# Altium footprint library 15.Switches&Relay.PcbLib: 33 footprints (part 2 of 3)
Each footprint in its own frame and in the unit in brackets; x right, y up, seen from the top. Pads: shape width x height; smd on the part's side, far side on the other; paste and mask are expansions set on the pad; w line width, h text height; cw(c..) or ccw(c..) is an arc to the next point about the centre after c.
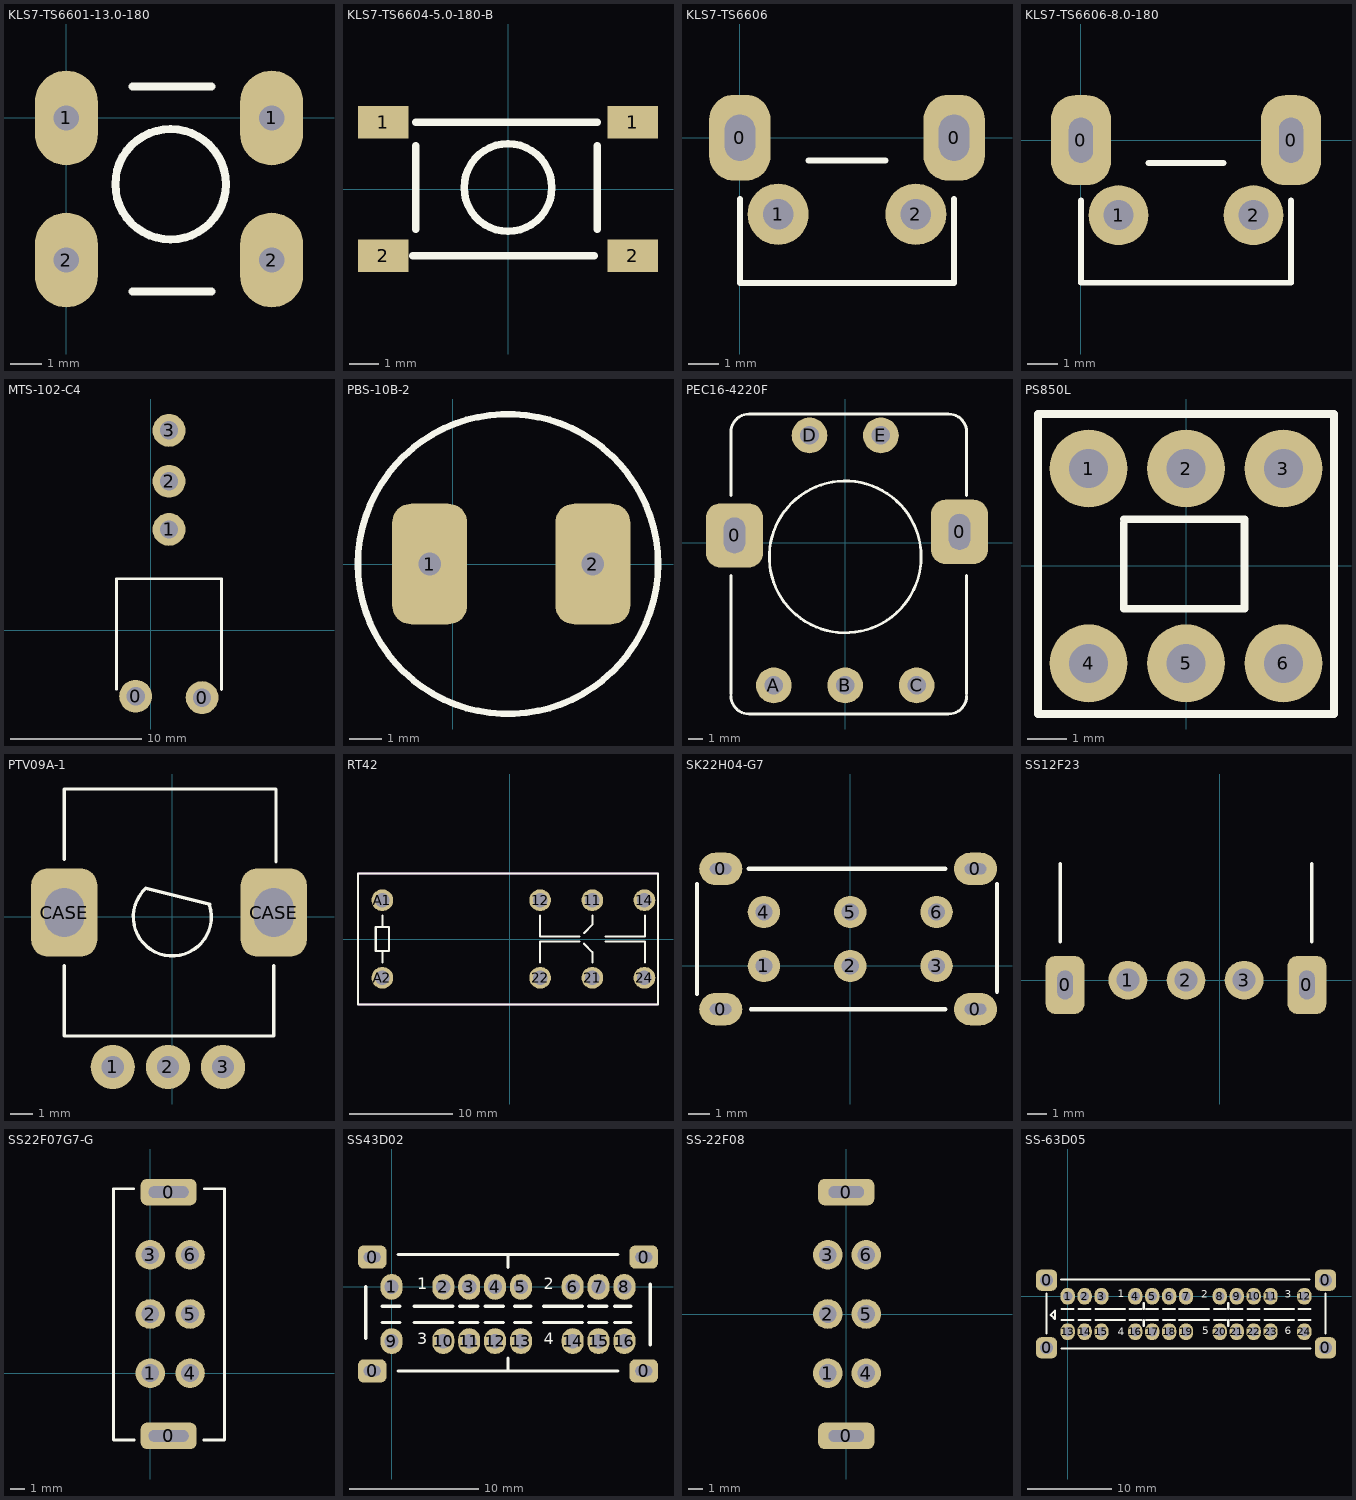
[diagram p1: the footprints below, top view; thin cyan lines are the x and y axes]

## KLS7-TS6601-13.0-180 [mm]
pads (4):
  oval 2x3 hole 0.8 square: 1(0,0) 1(6.5,0) 2(0,-4.5) 2(6.5,-4.5)
Top Overlay:
  circle w0.254: c3.3,-2.1 r1.75
  lines w0.254: 2.1,-5.5 4.6,-5.5 ; 2.1,1 4.6,1
3D body "button_hole_6x6x13.0.STEP": height 13, standoff -3.5, extent -0.763,-5.2 6.963,0.8

## KLS7-TS6604-5.0-180-B [mm]
pads (4):
  rect 1.7x1.1 smd: 1(-4.2,2.25) 1(4.2,2.25) 2(-4.2,-2.25) 2(4.2,-2.25)
Top Overlay:
  circle w0.254: c0,0.05 r1.476
  lines w0.254: -3.2,-2.25 2.9,-2.25 ; -3.1,-1.35 -3.1,1.45 ; -3.1,2.25 3,2.25 ; 3,-1.35 3,1.45
3D body "User Library-PTS645SL43SMTR92-LFS.STEP": height 4.5, standoff 0.2, extent -4.5,-3.05 4.5,2.95

## KLS7-TS6606 [mm]
pads (4):
  rrect80% 2x2.8 hole 1 slot 1.5 at 90 deg: 0(0,0) 0(7,0)
  round 2 hole 1: 1(1.25,-2.5) 2(5.75,-2.5)
Top Overlay:
  lines w0.2: 0,-2 0,-4.75 7,-4.75 7,-2 ; 2.25,-0.75 4.75,-0.75
3D body "User Library-Alps TACT SKHH Horizontal Switch.step": height 7.37, standoff -3.5, extent -0.679,-6.47 7.684,1.5

## KLS7-TS6606-8.0-180 [mm]
pads (4):
  rrect80% 2x3 hole 0.8 slot 1.5 at 90 deg: 0(0,0) 0(7,0)
  round 2 hole 1: 1(1.25,-2.5) 2(5.75,-2.5)
Top Overlay:
  lines w0.2: 0,-2 0,-4.75 7,-4.75 7,-2 ; 2.25,-0.75 4.75,-0.75
3D body "User Library-TS-A6PV-130.STEP": height 7.45, standoff -3.45, extent -0.25,-14.025 7.15,1.525

## MTS-102-C4 [mm]
pads (5):
  round 2.5 hole 1.4: 0(-1.142,-5.033) 0(3.915,-5.139) 1(1.4,7.661) 2(1.4,11.332) 3(1.4,15.2)
Top Overlay:
  lines w0.2: -2.6,-4.5 -2.6,3.9 5.4,3.9 5.4,-4.525
3D body "User Library-MTS.step": height 13.6, standoff -2.8, extent -2.55,-19.495 5.35,15.65

## PBS-10B-2 [mm]
pads (2):
  rrect50% 2.3x3.7 hole 0.7 square: 1(-0.7,0) 2(4.3,0)
Top Overlay:
  circle w0.2: c1.7,0 r4.6
3D body "User Library-PBS-10B.STEP": height 24.5, standoff -3.25, extent -2.95,-4.75 6.55,4.75

## PEC16-4220F [mm]
pads (7):
  rrect50% 4x4.5 hole 2.5 slot 1.5 at 0 deg: 0(-7.75,0.5) 0(8,0.75)
  round 2.5 hole 1.3: A(-5,-10) B(0,-10) C(5,-10) D(-2.5,7.5) E(2.5,7.5)
Top Overlay:
  circle w0.2: c0,-1 r5.315
  lines w0.2: -8,-10.73 ccw(c-6.73,-10.73) -6.73,-12 7.23,-12 ccw(c7.23,-10.73) 8.5,-10.73 ; -8,-10.6 -8,-2.3 ; -8,3.3 -8,7.73 cw(c-6.73,7.73) -6.73,9 0,9 7.23,9 cw(c7.23,7.73) 8.5,7.73 8.5,3.3 ; 8.5,-10.6 8.5,-2.3
3D body "User Library-Encoder PEC16-4220F-S0024 BOURNS.step": height 28, standoff -3.5, extent -8.175,-11.95 8.325,8.85

## PS850L [mm]
pads (6):
  round 2 hole 1: 1(-2.5,2.5) 2(0,2.5) 3(2.5,2.5) 4(-2.5,-2.5) 5(0,-2.5) 6(2.5,-2.5)
Top Overlay:
  lines w0.2: -3.8,3.6 -3.8,3.8 -3.8,3.9 3.8,3.9 3.8,-3.8 -3.8,-3.8 -3.8,3.7 ; -1.6,1.1 -1.6,-1.1 1.5,-1.1 1.5,1.2 -1.6,1.2
3D body "User Library-button with fixation.step": height 13.3, standoff -3.7, extent -3.5,-3.5 3.5,3.5

## PTV09A-1 [mm]
pads (5):
  round 2 hole 1: 1(-2.7,-6.8) 2(-0.2,-6.8) 3(2.3,-6.8)
  rrect50% 3x4 hole 2.2 slot 1.8 at 0 deg: CASE(-4.9,0.2) CASE(4.6,0.2)
Top Overlay:
  lines w0.15: -4.9,-2.2 -4.9,-5.4 4.6,-5.4 4.6,-2.2 ; -4.9,2.6 -4.9,5.8 4.7,5.8 4.7,2.5 ; 1.689,0.528 cw(c0,0) -1.2,1.3 1.694,0.576
3D body "User Library-Knob-4.step": height 27.21, standoff 11.96, extent -7.628,-7.514 7.3,7.414
3D body "R-0904N-L-25F-black.step": height 25, standoff -3.8, extent -5.861,-6.8 5.461,5.8

## RT42 [mm]
pads (8):
  round 2.1 hole 1.4: 11(7.981,3.75) 12(2.941,3.75) 14(13.021,3.75) 21(7.981,-3.75) 22(2.941,-3.75) 24(13.021,-3.75) A1(-12.319,3.75) A2(-12.319,-3.75)
Top Overlay:
  lines w0.2: -12.319,-2.286 -12.319,-1.143 ; -12.319,1.143 -12.319,2.274 ; 2.921,-2.286 2.941,-0.254 6.731,-0.254 ; 2.921,2.274 2.921,0.254 6.731,0.254 ; 7.181,0.565 7.981,1.396 7.981,2.274 ; 7.182,-0.447 7.981,-1.27 7.981,-2.286 ; 9.271,-0.254 13.081,-0.254 13.081,-2.286 ; 9.271,0.254 13.081,0.254 13.081,2.274 ; -12.319,-1.143 -11.684,-1.143 -11.684,1.143 -12.954,1.143 -12.954,-1.143 -12.319,-1.143 ; -14.669,-6.35 -14.669,6.35 14.331,6.35 14.331,-6.35 -14.669,-6.35
Mechanical 13:
  lines w0.2: -14.669,-6.35 -14.669,6.35 14.331,6.35 14.331,-6.35 -14.669,-6.35
3D body "RT424005.stp": height 15.86, standoff -2.94, extent -14.529,-6.35 14.471,6.35

## SK22H04-G7 [mm]
pads (10):
  rrect100% 2x1.5 hole 1 slot 0.5 at 90 deg: 0(-6,-2) 0(-6,4.5) 0(5.8,-2) 0(5.8,4.5)
  round 1.5 hole 0.8: 1(-4,0) 2(0,0) 3(4,0) 4(-4,2.5) 5(0,2.5) 6(4,2.5)
Top Overlay:
  lines w0.2: -7.1,-1.3 -7.1,3.8 ; -4.7,4.5 4.4,4.5 ; -4.6,-2 4.4,-2 ; 6.8,-1.2 6.8,3.8
3D body: height 3, standoff -1, extent -6.2,-2.2 -5.8,-1.8
3D body: height 3, standoff -1, extent 5.6,-2.3 6,-1.9
3D body: height 3, standoff -1, extent 0,2.2 0.4,2.6
3D body: height 3, standoff -1, extent 3.8,2.2 4.2,2.6
3D body: height 3, standoff -1, extent -4.1,2.3 -3.7,2.7
3D body: height 3, standoff -1, extent 3.8,-0.2 4.2,0.2
3D body: height 3, standoff -1, extent 0,-0.3 0.4,0.1
3D body: height 3, standoff -1, extent -4.1,-0.2 -3.7,0.2
3D body: height 6.5, standoff 4, extent -2.4,-9 0.1,-2
3D body: height 8.5, standoff 3, extent -7.1,-2 6.8,4.5
3D body: height 3, standoff -1, extent 5.9,4.2 6.3,4.6
3D body: height 3, standoff -1, extent -6.1,4.3 -5.7,4.7

## SS12F23 [mm]
pads (5):
  rrect50% 2x3 hole 1.5 slot 0.8 at 0 deg: 0(-8,-0.25) 0(4.5,-0.25)
  round 2 hole 1.2: 1(-4.75,0) 2(-1.75,0) 3(1.25,0)
Top Overlay:
  lines w0.2: -8.25,2 -8.25,6 ; 4.75,2 4.75,6
3D body "User Library-SLIDE SWITCH SS12F23.STEP": height 5.95, standoff -3.15, extent -8.25,-0.75 4.75,12.15

## SS22F07G7-G [mm]
pads (8):
  rrect50% 3.8x1.8 hole 2.7 slot 0.8 at 90 deg: 0(1.25,-4.25) 0(1.25,12.25)
  round 2 hole 1.2: 1(0,0) 2(0,4) 3(0,8) 4(2.7,0) 5(2.7,4) 6(2.7,8)
Top Overlay:
  lines w0.2: -1.125,12.475 -2.475,12.475 -2.475,-4.525 -1.075,-4.525 ; 3.625,-4.525 5.025,-4.525 5.025,12.475 3.675,12.475
3D body "User Library-SS22F07G7-G.STEP": height 16.08, standoff -2.4, extent -2.475,-4.525 5.025,12.475

## SS43D02 [mm]
pads (20):
  rrect50% 2.2x1.8 hole 1.3 slot 0.8 at 90 deg: 0(-1.5,-6.5) 0(-1.5,2.3) 0(19.5,-6.5) 0(19.5,2.3)
  oval 1.7x2 hole 1.1: 1(0,0) 2(4,0) 3(6,0) 4(8,0) 5(10,0) 6(14,0) 7(16,0) 8(18,0) 9(0,-4.2) 10(4,-4.2) 11(6,-4.2) 12(8,-4.2) 13(10,-4.2) 14(14,-4.2) 15(16,-4.2) 16(18,-4.2)
Top Overlay:
  lines w0.254: -2,-4 -2,0 ; -0.75,-2.75 0.65,-2.75 ; -0.75,-1.5 0.65,-1.5 ; 0.5,-6.5 17.5,-6.5 ; 0.5,2.5 17.5,2.5 ; 1.75,-2.75 4.75,-2.75 ; 1.75,-1.5 4.75,-1.5 ; 5.25,-2.75 6.65,-2.75 ; 5.25,-1.5 6.65,-1.5 ; 7.25,-2.75 8.65,-2.75 ; 7.25,-1.5 8.65,-1.5 ; 9,-6.5 9,-5.5 ; 9,1.5 9,2.5 ; 9.5,-2.75 10.75,-2.75 ; 9.5,-1.5 10.75,-1.5 ; 11.75,-2.75 14.75,-2.75 ; 11.75,-1.5 14.75,-1.5 ; 15.25,-2.75 16.65,-2.75 ; 15.25,-1.5 16.65,-1.5 ; 17.25,-2.75 18.5,-2.75 ; 17.25,-1.5 18.5,-1.5 ; 20,-4.5 20,0.2
  text "1" at 2,-0.5 h1.52
  text "2" at 11.75,-0.5 h1.52
  text "3" at 2,-4.75 h1.52
  text "4" at 11.75,-4.75 h1.52
3D body: height 8, standoff -1, extent 13.8,-4.4 14.2,-4
3D body: height 8, standoff -1, extent 15.8,-4.4 16.2,-4
3D body: height 8, standoff -1, extent 17.8,-4.4 18.2,-4
3D body: height 8, standoff -1, extent 17.9,-0.2 18.3,0.2
3D body: height 8, standoff -1, extent 15.9,-0.2 16.3,0.2
3D body: height 8, standoff -1, extent 13.9,-0.2 14.3,0.2
3D body: height 8, standoff -1, extent -0.2,-4.4 0.2,-4
3D body: height 8, standoff -1, extent 3.8,-4.4 4.2,-4
3D body: height 8, standoff -1, extent 5.8,-4.4 6.2,-4
3D body: height 8, standoff -1, extent 7.8,-4.4 8.2,-4
3D body: height 8, standoff -1, extent 9.8,-4.4 10.2,-4
3D body: height 8, standoff -1, extent 9.8,-0.2 10.2,0.2
3D body: height 8, standoff -1, extent 7.8,-0.2 8.2,0.2
3D body: height 8, standoff -1, extent 5.8,-0.2 6.2,0.2
3D body: height 8, standoff -1, extent 3.8,-0.2 4.2,0.2
3D body: height 8, standoff -1, extent -0.2,-0.2 0.2,0.2
3D body: height 14, standoff 6, extent -1.9,-7 20.1,2.4
3D body: height 18, standoff 8, extent 3.875,-4.125 8.125,0.125
3D body: height 8, standoff -1, extent 18.937,-6.637 19.862,-6.162
3D body: height 8, standoff -1, extent 18.937,2.163 19.862,2.638
3D body: height 8, standoff -1, extent -2.063,-6.637 -1.138,-6.162
3D body: height 8, standoff -1, extent -2.063,2.162 -1.138,2.637

## SS-22F08 [mm]
pads (8):
  rrect50% 3.8x1.8 hole 2.4 slot 0.8 at 90 deg: 0(0,-8.25) 0(0,8.25)
  round 2 hole 1.2: 1(-1.25,-4) 2(-1.25,0) 3(-1.25,4) 4(1.35,-4) 5(1.35,0) 6(1.35,4)
3D body "User Library-ss22f07g10-g.step": height 20, standoff -1.7, extent -3.775,-8.55 3.625,8.45

## SS-63D05 [mm]
pads (28):
  rrect50% 2.5x2.5 hole 1.5: 0(-2.5,-6.1) 0(-2.5,1.9) 0(30.5,-6.1) 0(30.5,1.9)
  oval 1.7x2 hole 1.1: 1(0,0) 2(2,0) 3(4,0) 4(8,0) 5(10,0) 6(12,0) 7(14,0) 8(18,0) 9(20,0) 10(22,0) 11(24,0) 12(28,0) 13(0,-4.2) 14(2,-4.2) 15(4,-4.2) 16(8,-4.2) 17(10,-4.2) 18(12,-4.2) 19(14,-4.2) 20(18,-4.2) 21(20,-4.2) 22(22,-4.2) 23(24,-4.2) 24(28,-4.2)
Top Overlay:
  lines w0.254: -2.5,-4.4 -2.5,0.3 ; -1.9,-2.3 -1.5,-2.7 -1.5,-1.7 -2,-2.2 ; -0.8,2 28.6,2 ; -0.7,-6.2 28.7,-6.2 ; -0.7,-2.8 0.7,-2.8 ; -0.7,-1.5 0.7,-1.5 ; 1.3,-2.8 2.7,-2.8 ; 1.3,-1.5 2.7,-1.5 ; 3.3,-2.8 6.8,-2.8 ; 3.3,-1.5 6.8,-1.5 ; 7.3,-2.8 8.7,-2.8 ; 7.3,-1.5 8.7,-1.5 ; 9,-3.5 9,-2.8 ; 9,-1.5 9,-0.8 ; 9.3,-2.8 10.7,-2.8 ; 9.3,-1.5 10.7,-1.5 ; 11.3,-2.8 12.7,-2.8 ; 11.3,-1.5 12.7,-1.5 ; 13.2,-2.8 16.7,-2.8 ; 13.2,-1.5 16.7,-1.5 ; 17.3,-2.8 18.7,-2.8 ; 17.3,-1.5 18.7,-1.5 ; 19,-3.5 19,-2.8 ; 19,-1.5 19,-0.8 ; 19.3,-2.8 20.7,-2.8 ; 19.3,-1.5 20.7,-1.5 ; 21.3,-2.8 22.7,-2.8 ; 21.3,-1.5 22.7,-1.5 ; 23.3,-2.8 26.8,-2.8 ; 23.3,-1.5 26.8,-1.5 ; 27.3,-2.8 28.7,-2.8 ; 27.3,-1.5 28.7,-1.5 ; 30.5,-4.4 30.5,0.3 ; -2,-2.2 -2,-2.2
  text "1" at 5.9,-0.4 h1.52
  text "2" at 15.8,-0.5 h1.52
  text "3" at 25.7,-0.5 h1.52
  text "4" at 5.9,-4.9 h1.52
  text "5" at 15.9,-4.8 h1.52
  text "6" at 25.7,-4.8 h1.52
3D body "User Library-Vimex SS-62H01-G6.step": height 19.6, standoff -2.2, extent -2.25,-6.725 29.75,2.725